# Altium footprint library ref-packages.PCBLIB: 1544 footprints (part 72 of 103)
Each footprint in its own frame and in the unit in brackets; x right, y up, seen from the top. Pads: shape width x height; smd on the part's side, far side on the other; paste and mask are expansions set on the pad; w line width, h text height; cw(c..) or ccw(c..) is an arc to the next point about the centre after c.
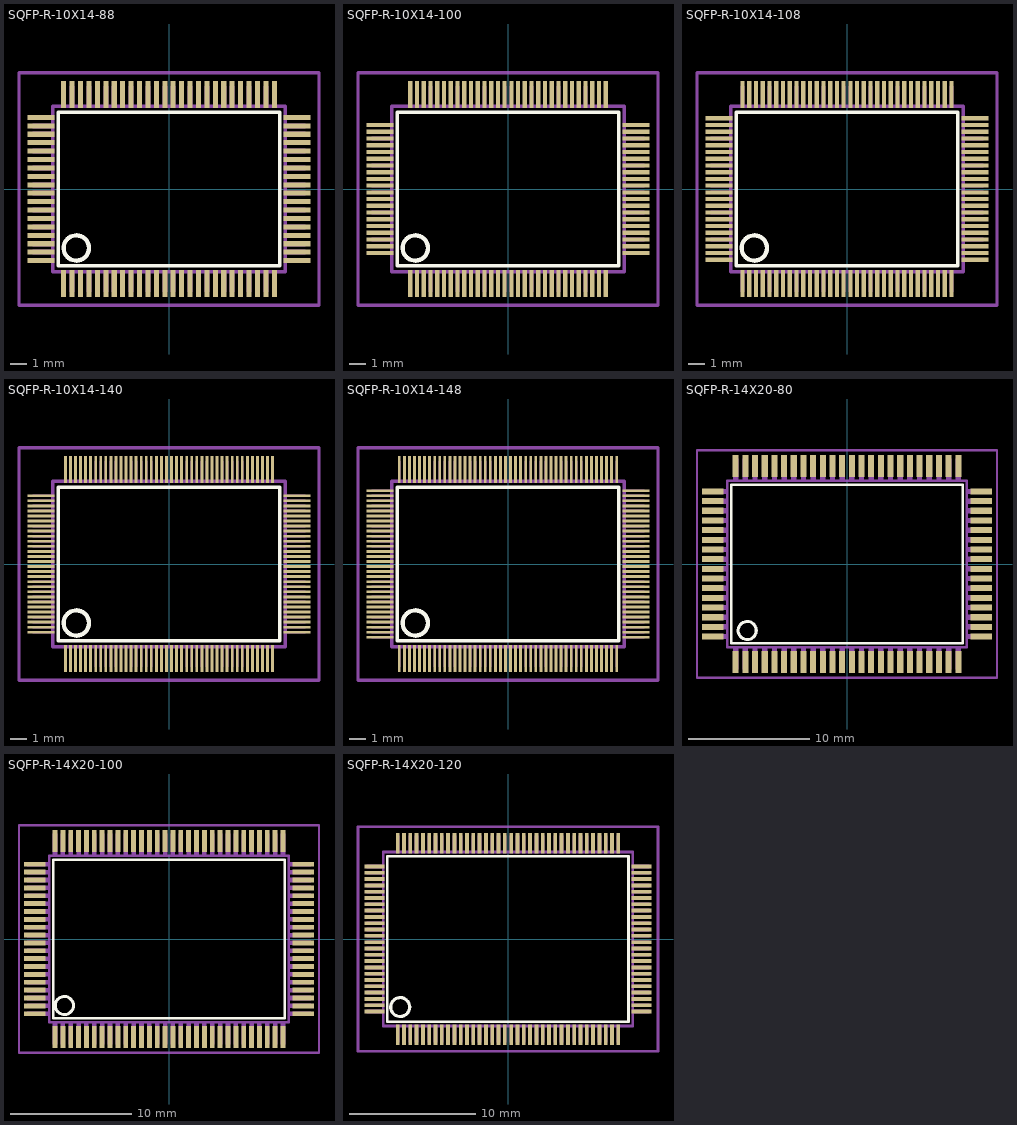
[diagram p71: the footprints below, top view; thin cyan lines are the x and y axes]

## SQFP-R-10X14-88 [mil]
pads (88):
  rect 11.81x62.99 smd: 1(-246.06,-220.47) 2(-226.38,-220.47) 3(-206.69,-220.47) 4(-187.01,-220.47) 5(-167.32,-220.47) 6(-147.64,-220.47) 7(-127.95,-220.47) 8(-108.27,-220.47) 9(-88.58,-220.47) 10(-68.9,-220.47) 11(-49.21,-220.47) 12(-29.53,-220.47) 13(-9.84,-220.47) 14(9.84,-220.47) 15(29.53,-220.47) 16(49.21,-220.47) 17(68.9,-220.47) 18(88.58,-220.47) 19(108.27,-220.47) 20(127.95,-220.47) 21(147.64,-220.47) 22(167.32,-220.47) 23(187.01,-220.47) 24(206.69,-220.47) 25(226.38,-220.47) 26(246.06,-220.47) 45(246.06,220.47) 46(226.38,220.47) 47(206.69,220.47) 48(187.01,220.47) 49(167.32,220.47) 50(147.64,220.47) 51(127.95,220.47) 52(108.27,220.47) 53(88.58,220.47) 54(68.9,220.47) 55(49.21,220.47) 56(29.53,220.47) 57(9.84,220.47) 58(-9.84,220.47) 59(-29.53,220.47) 60(-49.21,220.47) 61(-68.9,220.47) 62(-88.58,220.47) 63(-108.27,220.47) 64(-127.95,220.47) 65(-147.64,220.47) 66(-167.32,220.47) 67(-187.01,220.47) 68(-206.69,220.47) 69(-226.38,220.47) 70(-246.06,220.47)
  rect 62.99x11.81 smd: 27(299.21,-167.32) 28(299.21,-147.64) 29(299.21,-127.95) 30(299.21,-108.27) 31(299.21,-88.58) 32(299.21,-68.9) 33(299.21,-49.21) 34(299.21,-29.53) 35(299.21,-9.84) 36(299.21,9.84) 37(299.21,29.53) 38(299.21,49.21) 39(299.21,68.9) 40(299.21,88.58) 41(299.21,108.27) 42(299.21,127.95) 43(299.21,147.64) 44(299.21,167.32) 71(-299.21,167.32) 72(-299.21,147.64) 73(-299.21,127.95) 74(-299.21,108.27) 75(-299.21,88.58) 76(-299.21,68.9) 77(-299.21,49.21) 78(-299.21,29.53) 79(-299.21,9.84) 80(-299.21,-9.84) 81(-299.21,-29.53) 82(-299.21,-49.21) 83(-299.21,-68.9) 84(-299.21,-88.58) 85(-299.21,-108.27) 86(-299.21,-127.95) 87(-299.21,-147.64) 88(-299.21,-167.32)
Top Overlay:
  circle w10: c-216.54,-137.8 r29.53
  lines w8: -258.66,-179.53 258.27,-179.53 258.27,179.53 -258.66,179.53 -258.66,-179.53
Mechanical 16:
  rectangle: -251.97,-240.16 -240.16,-194.88
  rectangle: 273.62,-173.23 318.9,-161.42
  rectangle: -232.28,-240.16 -220.47,-194.88
  rectangle: -212.6,-240.16 -200.79,-194.88
  rectangle: -192.91,-240.16 -181.1,-194.88
  rectangle: -173.23,-240.16 -161.42,-194.88
  rectangle: -153.54,-240.16 -141.73,-194.88
  rectangle: -133.86,-240.16 -122.05,-194.88
  rectangle: -114.17,-240.16 -102.36,-194.88
  rectangle: -94.49,-240.16 -82.68,-194.88
  rectangle: -74.8,-240.16 -62.99,-194.88
  rectangle: -55.12,-240.16 -43.31,-194.88
  rectangle: -35.43,-240.16 -23.62,-194.88
  rectangle: -15.75,-240.16 -3.94,-194.88
  rectangle: 3.94,-240.16 15.75,-194.88
  rectangle: 23.62,-240.16 35.43,-194.88
  rectangle: 43.31,-240.16 55.12,-194.88
  rectangle: 62.99,-240.16 74.8,-194.88
  rectangle: 82.68,-240.16 94.49,-194.88
  rectangle: 102.36,-240.16 114.17,-194.88
  rectangle: 122.05,-240.16 133.86,-194.88
  rectangle: 141.73,-240.16 153.54,-194.88
  rectangle: 161.42,-240.16 173.23,-194.88
  rectangle: 181.1,-240.16 192.91,-194.88
  rectangle: 200.79,-240.16 212.6,-194.88
  rectangle: 220.47,-240.16 232.28,-194.88
  rectangle: 240.16,-240.16 251.97,-194.88
  rectangle: 273.62,-153.54 318.9,-141.73
  rectangle: 273.62,-133.86 318.9,-122.05
  rectangle: 273.62,-114.17 318.9,-102.36
  rectangle: 273.62,-94.49 318.9,-82.68
  rectangle: 273.62,-74.8 318.9,-62.99
  rectangle: 273.62,-55.12 318.9,-43.31
  rectangle: 273.62,-35.43 318.9,-23.62
  rectangle: 273.62,-15.75 318.9,-3.94
  rectangle: 273.62,3.94 318.9,15.75
  rectangle: 273.62,23.62 318.9,35.43
  rectangle: 273.62,43.31 318.9,55.12
  rectangle: 273.62,62.99 318.9,74.8
  rectangle: 273.62,82.68 318.9,94.49
  rectangle: 273.62,102.36 318.9,114.17
  rectangle: 273.62,122.05 318.9,133.86
  rectangle: 273.62,141.73 318.9,153.54
  rectangle: 273.62,161.42 318.9,173.23
  rectangle: 240.16,194.88 251.97,240.16
  rectangle: 220.47,194.88 232.28,240.16
  rectangle: 200.79,194.88 212.6,240.16
  rectangle: 181.1,194.88 192.91,240.16
  rectangle: 161.42,194.88 173.23,240.16
  rectangle: 141.73,194.88 153.54,240.16
  rectangle: 122.05,194.88 133.86,240.16
  rectangle: 102.36,194.88 114.17,240.16
  rectangle: 82.68,194.88 94.49,240.16
  rectangle: 62.99,194.88 74.8,240.16
  rectangle: 43.31,194.88 55.12,240.16
  rectangle: 23.62,194.88 35.43,240.16
  rectangle: 3.94,194.88 15.75,240.16
  rectangle: -15.75,194.88 -3.94,240.16
  rectangle: -35.43,194.88 -23.62,240.16
  rectangle: -55.12,194.88 -43.31,240.16
  rectangle: -74.8,194.88 -62.99,240.16
  rectangle: -94.49,194.88 -82.68,240.16
  rectangle: -114.17,194.88 -102.36,240.16
  rectangle: -133.86,194.88 -122.05,240.16
  rectangle: -153.54,194.88 -141.73,240.16
  rectangle: -173.23,194.88 -161.42,240.16
  rectangle: -192.91,194.88 -181.1,240.16
  rectangle: -212.6,194.88 -200.79,240.16
  rectangle: -232.28,194.88 -220.47,240.16
  rectangle: -251.97,194.88 -240.16,240.16
  rectangle: -318.9,161.42 -273.62,173.23
  rectangle: -318.9,141.73 -273.62,153.54
  rectangle: -318.9,122.05 -273.62,133.86
  rectangle: -318.9,102.36 -273.62,114.17
  rectangle: -318.9,82.68 -273.62,94.49
  rectangle: -318.9,62.99 -273.62,74.8
  rectangle: -318.9,43.31 -273.62,55.12
  rectangle: -318.9,23.62 -273.62,35.43
  rectangle: -318.9,3.94 -273.62,15.75
  rectangle: -318.9,-15.75 -273.62,-3.94
  rectangle: -318.9,-35.43 -273.62,-23.62
  rectangle: -318.9,-55.12 -273.62,-43.31
  rectangle: -318.9,-74.8 -273.62,-62.99
  rectangle: -318.9,-94.49 -273.62,-82.68
  rectangle: -318.9,-114.17 -273.62,-102.36
  rectangle: -318.9,-133.86 -273.62,-122.05
  rectangle: -318.9,-153.54 -273.62,-141.73
  rectangle: -318.9,-173.23 -273.62,-161.42
  lines w8: -271.65,-192.91 271.65,-192.91 271.65,192.91 -271.65,192.91 -271.65,-192.91
Mechanical 27:
  lines w7.87: -350.39,-271.65 -350.39,271.65 350.39,271.65 350.39,-271.65 -350.39,-271.65

## SQFP-R-10X14-100 [mm]
pads (100):
  rect 0.25x1.6 smd: 1(-5.8,-5.6) 2(-5.4,-5.6) 3(-5,-5.6) 4(-4.6,-5.6) 5(-4.2,-5.6) 6(-3.8,-5.6) 7(-3.4,-5.6) 8(-3,-5.6) 9(-2.6,-5.6) 10(-2.2,-5.6) 11(-1.8,-5.6) 12(-1.4,-5.6) 13(-1,-5.6) 14(-0.6,-5.6) 15(-0.2,-5.6) 16(0.2,-5.6) 17(0.6,-5.6) 18(1,-5.6) 19(1.4,-5.6) 20(1.8,-5.6) 21(2.2,-5.6) 22(2.6,-5.6) 23(3,-5.6) 24(3.4,-5.6) 25(3.8,-5.6) 26(4.2,-5.6) 27(4.6,-5.6) 28(5,-5.6) 29(5.4,-5.6) 30(5.8,-5.6) 51(5.8,5.6) 52(5.4,5.6) 53(5,5.6) 54(4.6,5.6) 55(4.2,5.6) 56(3.8,5.6) 57(3.4,5.6) 58(3,5.6) 59(2.6,5.6) 60(2.2,5.6) 61(1.8,5.6) 62(1.4,5.6) 63(1,5.6) 64(0.6,5.6) 65(0.2,5.6) 66(-0.2,5.6) 67(-0.6,5.6) 68(-1,5.6) 69(-1.4,5.6) 70(-1.8,5.6) 71(-2.2,5.6) 72(-2.6,5.6) 73(-3,5.6) 74(-3.4,5.6) 75(-3.8,5.6) 76(-4.2,5.6) 77(-4.6,5.6) 78(-5,5.6) 79(-5.4,5.6) 80(-5.8,5.6)
  rect 1.6x0.25 smd: 31(7.6,-3.8) 32(7.6,-3.4) 33(7.6,-3) 34(7.6,-2.6) 35(7.6,-2.2) 36(7.6,-1.8) 37(7.6,-1.4) 38(7.6,-1) 39(7.6,-0.6) 40(7.6,-0.2) 41(7.6,0.2) 42(7.6,0.6) 43(7.6,1) 44(7.6,1.4) 45(7.6,1.8) 46(7.6,2.2) 47(7.6,2.6) 48(7.6,3) 49(7.6,3.4) 50(7.6,3.8) 81(-7.6,3.8) 82(-7.6,3.4) 83(-7.6,3) 84(-7.6,2.6) 85(-7.6,2.2) 86(-7.6,1.8) 87(-7.6,1.4) 88(-7.6,1) 89(-7.6,0.6) 90(-7.6,0.2) 91(-7.6,-0.2) 92(-7.6,-0.6) 93(-7.6,-1) 94(-7.6,-1.4) 95(-7.6,-1.8) 96(-7.6,-2.2) 97(-7.6,-2.6) 98(-7.6,-3) 99(-7.6,-3.4) 100(-7.6,-3.8)
Top Overlay:
  circle w0.254: c-5.5,-3.5 r0.75
  lines w0.203: -6.57,-4.56 6.56,-4.56 6.56,4.56 -6.57,4.56 -6.57,-4.56
Mechanical 16:
  rectangle: -5.91,-6.1 -5.69,-4.95
  rectangle: 6.95,-3.91 8.1,-3.69
  rectangle: -5.51,-6.1 -5.29,-4.95
  rectangle: -5.11,-6.1 -4.89,-4.95
  rectangle: -4.71,-6.1 -4.49,-4.95
  rectangle: -4.31,-6.1 -4.09,-4.95
  rectangle: -3.91,-6.1 -3.69,-4.95
  rectangle: -3.51,-6.1 -3.29,-4.95
  rectangle: -3.11,-6.1 -2.89,-4.95
  rectangle: -2.71,-6.1 -2.49,-4.95
  rectangle: -2.31,-6.1 -2.09,-4.95
  rectangle: -1.91,-6.1 -1.69,-4.95
  rectangle: -1.51,-6.1 -1.29,-4.95
  rectangle: -1.11,-6.1 -0.89,-4.95
  rectangle: -0.71,-6.1 -0.49,-4.95
  rectangle: -0.31,-6.1 -0.09,-4.95
  rectangle: 0.09,-6.1 0.31,-4.95
  rectangle: 0.49,-6.1 0.71,-4.95
  rectangle: 0.89,-6.1 1.11,-4.95
  rectangle: 1.29,-6.1 1.51,-4.95
  rectangle: 1.69,-6.1 1.91,-4.95
  rectangle: 2.09,-6.1 2.31,-4.95
  rectangle: 2.49,-6.1 2.71,-4.95
  rectangle: 2.89,-6.1 3.11,-4.95
  rectangle: 3.29,-6.1 3.51,-4.95
  rectangle: 3.69,-6.1 3.91,-4.95
  rectangle: 4.09,-6.1 4.31,-4.95
  rectangle: 4.49,-6.1 4.71,-4.95
  rectangle: 4.89,-6.1 5.11,-4.95
  rectangle: 5.29,-6.1 5.51,-4.95
  rectangle: 5.69,-6.1 5.91,-4.95
  rectangle: 6.95,-3.51 8.1,-3.29
  rectangle: 6.95,-3.11 8.1,-2.89
  rectangle: 6.95,-2.71 8.1,-2.49
  rectangle: 6.95,-2.31 8.1,-2.09
  rectangle: 6.95,-1.91 8.1,-1.69
  rectangle: 6.95,-1.51 8.1,-1.29
  rectangle: 6.95,-1.11 8.1,-0.89
  rectangle: 6.95,-0.71 8.1,-0.49
  rectangle: 6.95,-0.31 8.1,-0.09
  rectangle: 6.95,0.09 8.1,0.31
  rectangle: 6.95,0.49 8.1,0.71
  rectangle: 6.95,0.89 8.1,1.11
  rectangle: 6.95,1.29 8.1,1.51
  rectangle: 6.95,1.69 8.1,1.91
  rectangle: 6.95,2.09 8.1,2.31
  rectangle: 6.95,2.49 8.1,2.71
  rectangle: 6.95,2.89 8.1,3.11
  rectangle: 6.95,3.29 8.1,3.51
  rectangle: 6.95,3.69 8.1,3.91
  rectangle: 5.69,4.95 5.91,6.1
  rectangle: 5.29,4.95 5.51,6.1
  rectangle: 4.89,4.95 5.11,6.1
  rectangle: 4.49,4.95 4.71,6.1
  rectangle: 4.09,4.95 4.31,6.1
  rectangle: 3.69,4.95 3.91,6.1
  rectangle: 3.29,4.95 3.51,6.1
  rectangle: 2.89,4.95 3.11,6.1
  rectangle: 2.49,4.95 2.71,6.1
  rectangle: 2.09,4.95 2.31,6.1
  rectangle: 1.69,4.95 1.91,6.1
  rectangle: 1.29,4.95 1.51,6.1
  rectangle: 0.89,4.95 1.11,6.1
  rectangle: 0.49,4.95 0.71,6.1
  rectangle: 0.09,4.95 0.31,6.1
  rectangle: -0.31,4.95 -0.09,6.1
  rectangle: -0.71,4.95 -0.49,6.1
  rectangle: -1.11,4.95 -0.89,6.1
  rectangle: -1.51,4.95 -1.29,6.1
  rectangle: -1.91,4.95 -1.69,6.1
  rectangle: -2.31,4.95 -2.09,6.1
  rectangle: -2.71,4.95 -2.49,6.1
  rectangle: -3.11,4.95 -2.89,6.1
  rectangle: -3.51,4.95 -3.29,6.1
  rectangle: -3.91,4.95 -3.69,6.1
  rectangle: -4.31,4.95 -4.09,6.1
  rectangle: -4.71,4.95 -4.49,6.1
  rectangle: -5.11,4.95 -4.89,6.1
  rectangle: -5.51,4.95 -5.29,6.1
  rectangle: -5.91,4.95 -5.69,6.1
  rectangle: -8.1,3.69 -6.95,3.91
  rectangle: -8.1,3.29 -6.95,3.51
  rectangle: -8.1,2.89 -6.95,3.11
  rectangle: -8.1,2.49 -6.95,2.71
  rectangle: -8.1,2.09 -6.95,2.31
  rectangle: -8.1,1.69 -6.95,1.91
  rectangle: -8.1,1.29 -6.95,1.51
  rectangle: -8.1,0.89 -6.95,1.11
  rectangle: -8.1,0.49 -6.95,0.71
  rectangle: -8.1,0.09 -6.95,0.31
  rectangle: -8.1,-0.31 -6.95,-0.09
  rectangle: -8.1,-0.71 -6.95,-0.49
  rectangle: -8.1,-1.11 -6.95,-0.89
  rectangle: -8.1,-1.51 -6.95,-1.29
  rectangle: -8.1,-1.91 -6.95,-1.69
  rectangle: -8.1,-2.31 -6.95,-2.09
  rectangle: -8.1,-2.71 -6.95,-2.49
  rectangle: -8.1,-3.11 -6.95,-2.89
  rectangle: -8.1,-3.51 -6.95,-3.29
  rectangle: -8.1,-3.91 -6.95,-3.69
  lines w0.203: -6.9,-4.9 6.9,-4.9 6.9,4.9 -6.9,4.9 -6.9,-4.9
Mechanical 27:
  lines w0.2: -8.9,-6.9 -8.9,6.9 8.9,6.9 8.9,-6.9 -8.9,-6.9

## SQFP-R-10X14-108 [mm]
pads (108):
  rect 0.25x1.6 smd: 1(-6.2,-5.6) 2(-5.8,-5.6) 3(-5.4,-5.6) 4(-5,-5.6) 5(-4.6,-5.6) 6(-4.2,-5.6) 7(-3.8,-5.6) 8(-3.4,-5.6) 9(-3,-5.6) 10(-2.6,-5.6) 11(-2.2,-5.6) 12(-1.8,-5.6) 13(-1.4,-5.6) 14(-1,-5.6) 15(-0.6,-5.6) 16(-0.2,-5.6) 17(0.2,-5.6) 18(0.6,-5.6) 19(1,-5.6) 20(1.4,-5.6) 21(1.8,-5.6) 22(2.2,-5.6) 23(2.6,-5.6) 24(3,-5.6) 25(3.4,-5.6) 26(3.8,-5.6) 27(4.2,-5.6) 28(4.6,-5.6) 29(5,-5.6) 30(5.4,-5.6) 31(5.8,-5.6) 32(6.2,-5.6) 55(6.2,5.6) 56(5.8,5.6) 57(5.4,5.6) 58(5,5.6) 59(4.6,5.6) 60(4.2,5.6) 61(3.8,5.6) 62(3.4,5.6) 63(3,5.6) 64(2.6,5.6) 65(2.2,5.6) 66(1.8,5.6) 67(1.4,5.6) 68(1,5.6) 69(0.6,5.6) 70(0.2,5.6) 71(-0.2,5.6) 72(-0.6,5.6) 73(-1,5.6) 74(-1.4,5.6) 75(-1.8,5.6) 76(-2.2,5.6) 77(-2.6,5.6) 78(-3,5.6) 79(-3.4,5.6) 80(-3.8,5.6) 81(-4.2,5.6) 82(-4.6,5.6) 83(-5,5.6) 84(-5.4,5.6) 85(-5.8,5.6) 86(-6.2,5.6)
  rect 1.6x0.25 smd: 33(7.6,-4.2) 34(7.6,-3.8) 35(7.6,-3.4) 36(7.6,-3) 37(7.6,-2.6) 38(7.6,-2.2) 39(7.6,-1.8) 40(7.6,-1.4) 41(7.6,-1) 42(7.6,-0.6) 43(7.6,-0.2) 44(7.6,0.2) 45(7.6,0.6) 46(7.6,1) 47(7.6,1.4) 48(7.6,1.8) 49(7.6,2.2) 50(7.6,2.6) 51(7.6,3) 52(7.6,3.4) 53(7.6,3.8) 54(7.6,4.2) 87(-7.6,4.2) 88(-7.6,3.8) 89(-7.6,3.4) 90(-7.6,3) 91(-7.6,2.6) 92(-7.6,2.2) 93(-7.6,1.8) 94(-7.6,1.4) 95(-7.6,1) 96(-7.6,0.6) 97(-7.6,0.2) 98(-7.6,-0.2) 99(-7.6,-0.6) 100(-7.6,-1) 101(-7.6,-1.4) 102(-7.6,-1.8) 103(-7.6,-2.2) 104(-7.6,-2.6) 105(-7.6,-3) 106(-7.6,-3.4) 107(-7.6,-3.8) 108(-7.6,-4.2)
Top Overlay:
  circle w0.254: c-5.5,-3.5 r0.75
  lines w0.203: -6.57,-4.56 6.56,-4.56 6.56,4.56 -6.57,4.56 -6.57,-4.56
Mechanical 16:
  rectangle: -6.31,-6.1 -6.09,-4.95
  rectangle: 6.95,-4.31 8.1,-4.09
  rectangle: -5.91,-6.1 -5.69,-4.95
  rectangle: -5.51,-6.1 -5.29,-4.95
  rectangle: -5.11,-6.1 -4.89,-4.95
  rectangle: -4.71,-6.1 -4.49,-4.95
  rectangle: -4.31,-6.1 -4.09,-4.95
  rectangle: -3.91,-6.1 -3.69,-4.95
  rectangle: -3.51,-6.1 -3.29,-4.95
  rectangle: -3.11,-6.1 -2.89,-4.95
  rectangle: -2.71,-6.1 -2.49,-4.95
  rectangle: -2.31,-6.1 -2.09,-4.95
  rectangle: -1.91,-6.1 -1.69,-4.95
  rectangle: -1.51,-6.1 -1.29,-4.95
  rectangle: -1.11,-6.1 -0.89,-4.95
  rectangle: -0.71,-6.1 -0.49,-4.95
  rectangle: -0.31,-6.1 -0.09,-4.95
  rectangle: 0.09,-6.1 0.31,-4.95
  rectangle: 0.49,-6.1 0.71,-4.95
  rectangle: 0.89,-6.1 1.11,-4.95
  rectangle: 1.29,-6.1 1.51,-4.95
  rectangle: 1.69,-6.1 1.91,-4.95
  rectangle: 2.09,-6.1 2.31,-4.95
  rectangle: 2.49,-6.1 2.71,-4.95
  rectangle: 2.89,-6.1 3.11,-4.95
  rectangle: 3.29,-6.1 3.51,-4.95
  rectangle: 3.69,-6.1 3.91,-4.95
  rectangle: 4.09,-6.1 4.31,-4.95
  rectangle: 4.49,-6.1 4.71,-4.95
  rectangle: 4.89,-6.1 5.11,-4.95
  rectangle: 5.29,-6.1 5.51,-4.95
  rectangle: 5.69,-6.1 5.91,-4.95
  rectangle: 6.09,-6.1 6.31,-4.95
  rectangle: 6.95,-3.91 8.1,-3.69
  rectangle: 6.95,-3.51 8.1,-3.29
  rectangle: 6.95,-3.11 8.1,-2.89
  rectangle: 6.95,-2.71 8.1,-2.49
  rectangle: 6.95,-2.31 8.1,-2.09
  rectangle: 6.95,-1.91 8.1,-1.69
  rectangle: 6.95,-1.51 8.1,-1.29
  rectangle: 6.95,-1.11 8.1,-0.89
  rectangle: 6.95,-0.71 8.1,-0.49
  rectangle: 6.95,-0.31 8.1,-0.09
  rectangle: 6.95,0.09 8.1,0.31
  rectangle: 6.95,0.49 8.1,0.71
  rectangle: 6.95,0.89 8.1,1.11
  rectangle: 6.95,1.29 8.1,1.51
  rectangle: 6.95,1.69 8.1,1.91
  rectangle: 6.95,2.09 8.1,2.31
  rectangle: 6.95,2.49 8.1,2.71
  rectangle: 6.95,2.89 8.1,3.11
  rectangle: 6.95,3.29 8.1,3.51
  rectangle: 6.95,3.69 8.1,3.91
  rectangle: 6.95,4.09 8.1,4.31
  rectangle: 6.09,4.95 6.31,6.1
  rectangle: 5.69,4.95 5.91,6.1
  rectangle: 5.29,4.95 5.51,6.1
  rectangle: 4.89,4.95 5.11,6.1
  rectangle: 4.49,4.95 4.71,6.1
  rectangle: 4.09,4.95 4.31,6.1
  rectangle: 3.69,4.95 3.91,6.1
  rectangle: 3.29,4.95 3.51,6.1
  rectangle: 2.89,4.95 3.11,6.1
  rectangle: 2.49,4.95 2.71,6.1
  rectangle: 2.09,4.95 2.31,6.1
  rectangle: 1.69,4.95 1.91,6.1
  rectangle: 1.29,4.95 1.51,6.1
  rectangle: 0.89,4.95 1.11,6.1
  rectangle: 0.49,4.95 0.71,6.1
  rectangle: 0.09,4.95 0.31,6.1
  rectangle: -0.31,4.95 -0.09,6.1
  rectangle: -0.71,4.95 -0.49,6.1
  rectangle: -1.11,4.95 -0.89,6.1
  rectangle: -1.51,4.95 -1.29,6.1
  rectangle: -1.91,4.95 -1.69,6.1
  rectangle: -2.31,4.95 -2.09,6.1
  rectangle: -2.71,4.95 -2.49,6.1
  rectangle: -3.11,4.95 -2.89,6.1
  rectangle: -3.51,4.95 -3.29,6.1
  rectangle: -3.91,4.95 -3.69,6.1
  rectangle: -4.31,4.95 -4.09,6.1
  rectangle: -4.71,4.95 -4.49,6.1
  rectangle: -5.11,4.95 -4.89,6.1
  rectangle: -5.51,4.95 -5.29,6.1
  rectangle: -5.91,4.95 -5.69,6.1
  rectangle: -6.31,4.95 -6.09,6.1
  rectangle: -8.1,4.09 -6.95,4.31
  rectangle: -8.1,3.69 -6.95,3.91
  rectangle: -8.1,3.29 -6.95,3.51
  rectangle: -8.1,2.89 -6.95,3.11
  rectangle: -8.1,2.49 -6.95,2.71
  rectangle: -8.1,2.09 -6.95,2.31
  rectangle: -8.1,1.69 -6.95,1.91
  rectangle: -8.1,1.29 -6.95,1.51
  rectangle: -8.1,0.89 -6.95,1.11
  rectangle: -8.1,0.49 -6.95,0.71
  rectangle: -8.1,0.09 -6.95,0.31
  rectangle: -8.1,-0.31 -6.95,-0.09
  rectangle: -8.1,-0.71 -6.95,-0.49
  rectangle: -8.1,-1.11 -6.95,-0.89
  rectangle: -8.1,-1.51 -6.95,-1.29
  rectangle: -8.1,-1.91 -6.95,-1.69
  rectangle: -8.1,-2.31 -6.95,-2.09
  rectangle: -8.1,-2.71 -6.95,-2.49
  rectangle: -8.1,-3.11 -6.95,-2.89
  rectangle: -8.1,-3.51 -6.95,-3.29
  rectangle: -8.1,-3.91 -6.95,-3.69
  rectangle: -8.1,-4.31 -6.95,-4.09
  lines w0.203: -6.9,-4.9 6.9,-4.9 6.9,4.9 -6.9,4.9 -6.9,-4.9
Mechanical 27:
  lines w0.2: -8.9,-6.9 -8.9,6.9 8.9,6.9 8.9,-6.9 -8.9,-6.9

## SQFP-R-10X14-140 [mm]
pads (140):
  rect 0.17x1.6 smd: 1(-6.15,-5.6) 2(-5.85,-5.6) 3(-5.55,-5.6) 4(-5.25,-5.6) 5(-4.95,-5.6) 6(-4.65,-5.6) 7(-4.35,-5.6) 8(-4.05,-5.6) 9(-3.75,-5.6) 10(-3.45,-5.6) 11(-3.15,-5.6) 12(-2.85,-5.6) 13(-2.55,-5.6) 14(-2.25,-5.6) 15(-1.95,-5.6) 16(-1.65,-5.6) 17(-1.35,-5.6) 18(-1.05,-5.6) 19(-0.75,-5.6) 20(-0.45,-5.6) 21(-0.15,-5.6) 22(0.15,-5.6) 23(0.45,-5.6) 24(0.75,-5.6) 25(1.05,-5.6) 26(1.35,-5.6) 27(1.65,-5.6) 28(1.95,-5.6) 29(2.25,-5.6) 30(2.55,-5.6) 31(2.85,-5.6) 32(3.15,-5.6) 33(3.45,-5.6) 34(3.75,-5.6) 35(4.05,-5.6) 36(4.35,-5.6) 37(4.65,-5.6) 38(4.95,-5.6) 39(5.25,-5.6) 40(5.55,-5.6) 41(5.85,-5.6) 42(6.15,-5.6) 71(6.15,5.6) 72(5.85,5.6) 73(5.55,5.6) 74(5.25,5.6) 75(4.95,5.6) 76(4.65,5.6) 77(4.35,5.6) 78(4.05,5.6) 79(3.75,5.6) 80(3.45,5.6) 81(3.15,5.6) 82(2.85,5.6) 83(2.55,5.6) 84(2.25,5.6) 85(1.95,5.6) 86(1.65,5.6) 87(1.35,5.6) 88(1.05,5.6) 89(0.75,5.6) 90(0.45,5.6) 91(0.15,5.6) 92(-0.15,5.6) 93(-0.45,5.6) 94(-0.75,5.6) 95(-1.05,5.6) 96(-1.35,5.6) 97(-1.65,5.6) 98(-1.95,5.6) 99(-2.25,5.6) 100(-2.55,5.6) 101(-2.85,5.6) 102(-3.15,5.6) 103(-3.45,5.6) 104(-3.75,5.6) 105(-4.05,5.6) 106(-4.35,5.6) 107(-4.65,5.6) 108(-4.95,5.6) 109(-5.25,5.6) 110(-5.55,5.6) 111(-5.85,5.6) 112(-6.15,5.6)
  rect 1.6x0.17 smd: 43(7.6,-4.05) 44(7.6,-3.75) 45(7.6,-3.45) 46(7.6,-3.15) 47(7.6,-2.85) 48(7.6,-2.55) 49(7.6,-2.25) 50(7.6,-1.95) 51(7.6,-1.65) 52(7.6,-1.35) 53(7.6,-1.05) 54(7.6,-0.75) 55(7.6,-0.45) 56(7.6,-0.15) 57(7.6,0.15) 58(7.6,0.45) 59(7.6,0.75) 60(7.6,1.05) 61(7.6,1.35) 62(7.6,1.65) 63(7.6,1.95) 64(7.6,2.25) 65(7.6,2.55) 66(7.6,2.85) 67(7.6,3.15) 68(7.6,3.45) 69(7.6,3.75) 70(7.6,4.05) 113(-7.6,4.05) 114(-7.6,3.75) 115(-7.6,3.45) 116(-7.6,3.15) 117(-7.6,2.85) 118(-7.6,2.55) 119(-7.6,2.25) 120(-7.6,1.95) 121(-7.6,1.65) 122(-7.6,1.35) 123(-7.6,1.05) 124(-7.6,0.75) 125(-7.6,0.45) 126(-7.6,0.15) 127(-7.6,-0.15) 128(-7.6,-0.45) 129(-7.6,-0.75) 130(-7.6,-1.05) 131(-7.6,-1.35) 132(-7.6,-1.65) 133(-7.6,-1.95) 134(-7.6,-2.25) 135(-7.6,-2.55) 136(-7.6,-2.85) 137(-7.6,-3.15) 138(-7.6,-3.45) 139(-7.6,-3.75) 140(-7.6,-4.05)
Top Overlay:
  circle w0.254: c-5.5,-3.5 r0.75
  lines w0.203: -6.57,-4.56 6.56,-4.56 6.56,4.56 -6.57,4.56 -6.57,-4.56
Mechanical 16:
  rectangle: -6.22,-6.1 -6.08,-4.95
  rectangle: 6.95,-4.12 8.1,-3.98
  rectangle: -5.92,-6.1 -5.78,-4.95
  rectangle: -5.62,-6.1 -5.48,-4.95
  rectangle: -5.32,-6.1 -5.18,-4.95
  rectangle: -5.02,-6.1 -4.88,-4.95
  rectangle: -4.72,-6.1 -4.58,-4.95
  rectangle: -4.42,-6.1 -4.28,-4.95
  rectangle: -4.12,-6.1 -3.98,-4.95
  rectangle: -3.82,-6.1 -3.68,-4.95
  rectangle: -3.52,-6.1 -3.38,-4.95
  rectangle: -3.22,-6.1 -3.08,-4.95
  rectangle: -2.92,-6.1 -2.78,-4.95
  rectangle: -2.62,-6.1 -2.48,-4.95
  rectangle: -2.32,-6.1 -2.18,-4.95
  rectangle: -2.02,-6.1 -1.88,-4.95
  rectangle: -1.72,-6.1 -1.58,-4.95
  rectangle: -1.42,-6.1 -1.28,-4.95
  rectangle: -1.12,-6.1 -0.98,-4.95
  rectangle: -0.82,-6.1 -0.68,-4.95
  rectangle: -0.52,-6.1 -0.38,-4.95
  rectangle: -0.22,-6.1 -0.08,-4.95
  rectangle: 0.08,-6.1 0.22,-4.95
  rectangle: 0.38,-6.1 0.52,-4.95
  rectangle: 0.68,-6.1 0.82,-4.95
  rectangle: 0.98,-6.1 1.12,-4.95
  rectangle: 1.28,-6.1 1.42,-4.95
  rectangle: 1.58,-6.1 1.72,-4.95
  rectangle: 1.88,-6.1 2.02,-4.95
  rectangle: 2.18,-6.1 2.32,-4.95
  rectangle: 2.48,-6.1 2.62,-4.95
  rectangle: 2.78,-6.1 2.92,-4.95
  rectangle: 3.08,-6.1 3.22,-4.95
  rectangle: 3.38,-6.1 3.52,-4.95
  rectangle: 3.68,-6.1 3.82,-4.95
  rectangle: 3.98,-6.1 4.12,-4.95
  rectangle: 4.28,-6.1 4.42,-4.95
  rectangle: 4.58,-6.1 4.72,-4.95
  rectangle: 4.88,-6.1 5.02,-4.95
  rectangle: 5.18,-6.1 5.32,-4.95
  rectangle: 5.48,-6.1 5.62,-4.95
  rectangle: 5.78,-6.1 5.92,-4.95
  rectangle: 6.08,-6.1 6.22,-4.95
  rectangle: 6.95,-3.82 8.1,-3.68
  rectangle: 6.95,-3.52 8.1,-3.38
  rectangle: 6.95,-3.22 8.1,-3.08
  rectangle: 6.95,-2.92 8.1,-2.78
  rectangle: 6.95,-2.62 8.1,-2.48
  rectangle: 6.95,-2.32 8.1,-2.18
  rectangle: 6.95,-2.02 8.1,-1.88
  rectangle: 6.95,-1.72 8.1,-1.58
  rectangle: 6.95,-1.42 8.1,-1.28
  rectangle: 6.95,-1.12 8.1,-0.98
  rectangle: 6.95,-0.82 8.1,-0.68
  rectangle: 6.95,-0.52 8.1,-0.38
  rectangle: 6.95,-0.22 8.1,-0.08
  rectangle: 6.95,0.08 8.1,0.22
  rectangle: 6.95,0.38 8.1,0.52